# Altium schematic symbol library jlcpcb_2025_04_inductors_extended_0603.schlib: 1269 symbols (part 6 of 7) (continued)
## SDCL1608CR22JTDF
designator L?  Inductance: 220nH
Inductor, 220nH, ±5%, 2.4Ω, 200mA, SMD 0603; Manufacturer: Sunlord; Manufacturer Part Number: SDCL1608CR22JTDF; Self-Resonant Frequency: 50MHz; Q Factor: 8@50MHz; Package Size: 0603; JLCPCB Basic Part: No; JLCPCB Part Number: C22476; Supplier 1: LCSC; Category: Inductors; Supplier Part Number 1: C22476; Tolerance: ±5%; Rated Current: 200mA; DC Resistance: 2.4Ω; RoHS: Yes; ComponentLink1Description: Datasheet; ComponentLink1URL: https://wmsc.lcsc.com/wmsc/upload/file/pdf/v2/lcsc/2310301641_Sunlord-SDCL1608CR22JTDF_C22476.pdf; ComponentLink2Description: JLCPCB Part URL; ComponentLink2URL: https://jlcpcb.com/partdetail/C22476; ComponentLink3Description: LCSC Part URL; ComponentLink3URL: https://lcsc.com/product-detail/Inductors-SMD_Sunlord-Sunlord-SDCL1608CR22JTDF_C22476.html
footprint IND-0603 (0603 (1608M) Inductor)
pins: 1, 2

## SDCL1608CR27JTDF
designator L?  Inductance: 270nH
Inductor, 270nH, ±5%, 2.6Ω, 150mA, SMD 0603; Manufacturer: Sunlord; Manufacturer Part Number: SDCL1608CR27JTDF; Self-Resonant Frequency: 50MHz; Q Factor: 8@50MHz; Package Size: 0603; JLCPCB Basic Part: No; JLCPCB Part Number: C51060; Supplier 1: LCSC; Category: Inductors; Supplier Part Number 1: C51060; Tolerance: ±5%; Rated Current: 150mA; DC Resistance: 2.6Ω; RoHS: Yes; ComponentLink1Description: Datasheet; ComponentLink1URL: https://wmsc.lcsc.com/wmsc/upload/file/pdf/v2/lcsc/2310301641_Sunlord-SDCL1608CR27JTDF_C51060.pdf; ComponentLink2Description: JLCPCB Part URL; ComponentLink2URL: https://jlcpcb.com/partdetail/C51060; ComponentLink3Description: LCSC Part URL; ComponentLink3URL: https://lcsc.com/product-detail/Inductors-SMD_Sunlord-Sunlord-SDCL1608CR27JTDF_C51060.html
footprint IND-0603 (0603 (1608M) Inductor)
pins: 1, 2

## SDCL1608CR33JTDF
designator L?  Inductance: 330nH
Inductor, 330nH, ±5%, 2.8Ω, 150mA, SMD 0603; Manufacturer: Sunlord; Manufacturer Part Number: SDCL1608CR33JTDF; Self-Resonant Frequency: 50MHz; Q Factor: 8@50MHz; Package Size: 0603; JLCPCB Basic Part: No; JLCPCB Part Number: C46859; Supplier 1: LCSC; Category: Inductors; Supplier Part Number 1: C46859; Tolerance: ±5%; Rated Current: 150mA; DC Resistance: 2.8Ω; RoHS: Yes; ComponentLink1Description: Datasheet; ComponentLink1URL: https://wmsc.lcsc.com/wmsc/upload/file/pdf/v2/lcsc/2310301641_Sunlord-SDCL1608CR33JTDF_C46859.pdf; ComponentLink2Description: JLCPCB Part URL; ComponentLink2URL: https://jlcpcb.com/partdetail/C46859; ComponentLink3Description: LCSC Part URL; ComponentLink3URL: https://lcsc.com/product-detail/Inductors-SMD_Sunlord-Sunlord-SDCL1608CR33JTDF_C46859.html
footprint IND-0603 (0603 (1608M) Inductor)
pins: 1, 2

## SDCL1608CR39JTDF
designator L?  Inductance: 390nH
Inductor, 390nH, ±5%, 3.2Ω, 150mA, SMD 0603; Manufacturer: Sunlord; Manufacturer Part Number: SDCL1608CR39JTDF; Self-Resonant Frequency: 50MHz; Q Factor: 8@50MHz; Package Size: 0603; JLCPCB Basic Part: No; JLCPCB Part Number: C15565; Supplier 1: LCSC; Category: Inductors; Supplier Part Number 1: C15565; Tolerance: ±5%; Rated Current: 150mA; DC Resistance: 3.2Ω; RoHS: Yes; ComponentLink1Description: Datasheet; ComponentLink1URL: https://wmsc.lcsc.com/wmsc/upload/file/pdf/v2/lcsc/2310301641_Sunlord-SDCL1608CR39JTDF_C15565.pdf; ComponentLink2Description: JLCPCB Part URL; ComponentLink2URL: https://jlcpcb.com/partdetail/C15565; ComponentLink3Description: LCSC Part URL; ComponentLink3URL: https://lcsc.com/product-detail/Inductors-SMD_Sunlord-Sunlord-SDCL1608CR39JTDF_C15565.html
footprint IND-0603 (0603 (1608M) Inductor)
pins: 1, 2

## SDCL1608CR47JTDF
designator L?  Inductance: 470nH
Inductor, 470nH, ±5%, 3.6Ω, 150mA, SMD 0603; Manufacturer: Sunlord; Manufacturer Part Number: SDCL1608CR47JTDF; Self-Resonant Frequency: 50MHz; Q Factor: 8@50MHz; Package Size: 0603; JLCPCB Basic Part: No; JLCPCB Part Number: C21307; Supplier 1: LCSC; Category: Inductors; Supplier Part Number 1: C21307; Tolerance: ±5%; Rated Current: 150mA; DC Resistance: 3.6Ω; RoHS: Yes; ComponentLink1Description: Datasheet; ComponentLink1URL: https://wmsc.lcsc.com/wmsc/upload/file/pdf/v2/lcsc/2310301641_Sunlord-SDCL1608CR47JTDF_C21307.pdf; ComponentLink2Description: JLCPCB Part URL; ComponentLink2URL: https://jlcpcb.com/partdetail/C21307; ComponentLink3Description: LCSC Part URL; ComponentLink3URL: https://lcsc.com/product-detail/Inductors-SMD_Sunlord-Sunlord-SDCL1608CR47JTDF_C21307.html
footprint IND-0603 (0603 (1608M) Inductor)
pins: 1, 2

## SDCL1608CR56JTDF
designator L?  Inductance: 560nH
Inductor, 560nH, ±5%, 4Ω, 100mA, SMD 0603; Manufacturer: Sunlord; Manufacturer Part Number: SDCL1608CR56JTDF; Self-Resonant Frequency: 50MHz; Q Factor: 8@50MHz; Package Size: 0603; JLCPCB Basic Part: No; JLCPCB Part Number: C83787; Supplier 1: LCSC; Category: Inductors; Supplier Part Number 1: C83787; Tolerance: ±5%; Rated Current: 100mA; DC Resistance: 4Ω; RoHS: Yes; ComponentLink1Description: Datasheet; ComponentLink1URL: https://wmsc.lcsc.com/wmsc/upload/file/pdf/v2/lcsc/2310301641_Sunlord-SDCL1608CR56JTDF_C83787.pdf; ComponentLink2Description: JLCPCB Part URL; ComponentLink2URL: https://jlcpcb.com/partdetail/C83787; ComponentLink3Description: LCSC Part URL; ComponentLink3URL: https://lcsc.com/product-detail/Inductors-SMD_Sunlord-Sunlord-SDCL1608CR56JTDF_C83787.html
footprint IND-0603 (0603 (1608M) Inductor)
pins: 1, 2

## SDCL1608CR68JTDF
designator L?  Inductance: 680nH
Inductor, 680nH, ±5%, 4.5Ω, 100mA, SMD 0603; Manufacturer: Sunlord; Manufacturer Part Number: SDCL1608CR68JTDF; Self-Resonant Frequency: 50MHz; Q Factor: 8@50MHz; Package Size: 0603; JLCPCB Basic Part: No; JLCPCB Part Number: C55546; Supplier 1: LCSC; Category: Inductors; Supplier Part Number 1: C55546; Tolerance: ±5%; Rated Current: 100mA; DC Resistance: 4.5Ω; RoHS: Yes; ComponentLink1Description: Datasheet; ComponentLink1URL: https://wmsc.lcsc.com/wmsc/upload/file/pdf/v2/lcsc/2310301641_Sunlord-SDCL1608CR68JTDF_C55546.pdf; ComponentLink2Description: JLCPCB Part URL; ComponentLink2URL: https://jlcpcb.com/partdetail/C55546; ComponentLink3Description: LCSC Part URL; ComponentLink3URL: https://lcsc.com/product-detail/Inductors-SMD_Sunlord-Sunlord-SDCL1608CR68JTDF_C55546.html
footprint IND-0603 (0603 (1608M) Inductor)
pins: 1, 2

## SDFL1608L47NKTF
designator L?  Inductance: 47nH
Inductor, 47nH, ±10%, 300mΩ, 50mA, SMD 0603; Manufacturer: Sunlord; Manufacturer Part Number: SDFL1608L47NKTF; Self-Resonant Frequency: 50MHz; Q Factor: 10@50MHz; Package Size: 0603; JLCPCB Basic Part: No; JLCPCB Part Number: C370262; Supplier 1: LCSC; Category: Inductors; Supplier Part Number 1: C370262; Tolerance: ±10%; Rated Current: 50mA; DC Resistance: 300mΩ; RoHS: Yes; ComponentLink1Description: Datasheet; ComponentLink1URL: https://wmsc.lcsc.com/wmsc/upload/file/pdf/v2/lcsc/2310301641_Sunlord-SDFL1608L47NKTF_C370262.pdf; ComponentLink2Description: JLCPCB Part URL; ComponentLink2URL: https://jlcpcb.com/partdetail/C370262; ComponentLink3Description: LCSC Part URL; ComponentLink3URL: https://lcsc.com/product-detail/Inductors-SMD_Sunlord-Sunlord-SDFL1608L47NKTF_C370262.html
footprint IND-0603 (0603 (1608M) Inductor)
pins: 1, 2

## SDFL1608L82NKTF
designator L?  Inductance: 82nH
Inductor, 82nH, ±10%, 300mΩ, 50mA, SMD 0603; Manufacturer: Sunlord; Manufacturer Part Number: SDFL1608L82NKTF; Self-Resonant Frequency: 50MHz; Q Factor: 10@50MHz; Package Size: 0603; JLCPCB Basic Part: No; JLCPCB Part Number: C370263; Supplier 1: LCSC; Category: Inductors; Supplier Part Number 1: C370263; Tolerance: ±10%; Rated Current: 50mA; DC Resistance: 300mΩ; RoHS: Yes; ComponentLink1Description: Datasheet; ComponentLink1URL: https://wmsc.lcsc.com/wmsc/upload/file/pdf/v2/lcsc/2310301641_Sunlord-SDFL1608L82NKTF_C370263.pdf; ComponentLink2Description: JLCPCB Part URL; ComponentLink2URL: https://jlcpcb.com/partdetail/C370263; ComponentLink3Description: LCSC Part URL; ComponentLink3URL: https://lcsc.com/product-detail/Inductors-SMD_Sunlord-Sunlord-SDFL1608L82NKTF_C370263.html
footprint IND-0603 (0603 (1608M) Inductor)
pins: 1, 2

## SDFL1608LR10KTF
designator L?  Inductance: 100nH
Inductor, 100nH, ±10%, 500mΩ, 50mA, SMD 0603; Manufacturer: Sunlord; Manufacturer Part Number: SDFL1608LR10KTF; Q Factor: 15@25MHz; Package Size: 0603; JLCPCB Basic Part: No; JLCPCB Part Number: C279840; Supplier 1: LCSC; Category: Inductors; Supplier Part Number 1: C279840; Tolerance: ±10%; Rated Current: 50mA; DC Resistance: 500mΩ; RoHS: Yes; ComponentLink1Description: Datasheet; ComponentLink1URL: https://wmsc.lcsc.com/wmsc/upload/file/pdf/v2/lcsc/2310301641_Sunlord-SDFL1608LR10KTF_C279840.pdf; ComponentLink2Description: JLCPCB Part URL; ComponentLink2URL: https://jlcpcb.com/partdetail/C279840; ComponentLink3Description: LCSC Part URL; ComponentLink3URL: https://lcsc.com/product-detail/Inductors-SMD_Sunlord-Sunlord-SDFL1608LR10KTF_C279840.html
footprint IND-0603 (0603 (1608M) Inductor)
pins: 1, 2

## SDFL1608LR12KTF
designator L?  Inductance: 120nH
Inductor, 120nH, ±10%, 500mΩ, 50mA, SMD 0603; Manufacturer: Sunlord; Manufacturer Part Number: SDFL1608LR12KTF; Self-Resonant Frequency: 25MHz; Q Factor: 15@25MHz; Package Size: 0603; JLCPCB Basic Part: No; JLCPCB Part Number: C95957; Supplier 1: LCSC; Category: Inductors; Supplier Part Number 1: C95957; Tolerance: ±10%; Rated Current: 50mA; DC Resistance: 500mΩ; RoHS: Yes; ComponentLink1Description: Datasheet; ComponentLink1URL: https://wmsc.lcsc.com/wmsc/upload/file/pdf/v2/lcsc/2310301641_Sunlord-SDFL1608LR12KTF_C95957.pdf; ComponentLink2Description: JLCPCB Part URL; ComponentLink2URL: https://jlcpcb.com/partdetail/C95957; ComponentLink3Description: LCSC Part URL; ComponentLink3URL: https://lcsc.com/product-detail/Inductors-SMD_Sunlord-Sunlord-SDFL1608LR12KTF_C95957.html
footprint IND-0603 (0603 (1608M) Inductor)
pins: 1, 2

## SDFL1608LR15KTF
designator L?  Inductance: 150nH
Inductor, 150nH, ±10%, 600mΩ, 50mA, SMD 0603; Manufacturer: Sunlord; Manufacturer Part Number: SDFL1608LR15KTF; Self-Resonant Frequency: 25MHz; Q Factor: 15@25MHz; Package Size: 0603; JLCPCB Basic Part: No; JLCPCB Part Number: C279935; Supplier 1: LCSC; Category: Inductors; Supplier Part Number 1: C279935; Tolerance: ±10%; Rated Current: 50mA; DC Resistance: 600mΩ; RoHS: Yes; ComponentLink1Description: Datasheet; ComponentLink1URL: https://wmsc.lcsc.com/wmsc/upload/file/pdf/v2/lcsc/2310301641_Sunlord-SDFL1608LR15KTF_C279935.pdf; ComponentLink2Description: JLCPCB Part URL; ComponentLink2URL: https://jlcpcb.com/partdetail/C279935; ComponentLink3Description: LCSC Part URL; ComponentLink3URL: https://lcsc.com/product-detail/Inductors-SMD_Sunlord-Sunlord-SDFL1608LR15KTF_C279935.html
footprint IND-0603 (0603 (1608M) Inductor)
pins: 1, 2

## SDFL1608LR27KTF
designator L?  Inductance: 270nH
Inductor, 270nH, ±10%, 800mΩ, 50mA, SMD 0603; Manufacturer: Sunlord; Manufacturer Part Number: SDFL1608LR27KTF; Self-Resonant Frequency: 25MHz; Q Factor: 15@25MHz; Package Size: 0603; JLCPCB Basic Part: No; JLCPCB Part Number: C95959; Supplier 1: LCSC; Category: Inductors; Supplier Part Number 1: C95959; Tolerance: ±10%; Rated Current: 50mA; DC Resistance: 800mΩ; RoHS: Yes; ComponentLink1Description: Datasheet; ComponentLink1URL: https://wmsc.lcsc.com/wmsc/upload/file/pdf/v2/lcsc/2310301641_Sunlord-SDFL1608LR27KTF_C95959.pdf; ComponentLink2Description: JLCPCB Part URL; ComponentLink2URL: https://jlcpcb.com/partdetail/C95959; ComponentLink3Description: LCSC Part URL; ComponentLink3URL: https://lcsc.com/product-detail/Inductors-SMD_Sunlord-Sunlord-SDFL1608LR27KTF_C95959.html
footprint IND-0603 (0603 (1608M) Inductor)
pins: 1, 2

## SDFL1608LR33KTF
designator L?  Inductance: 330nH
Inductor, 330nH, ±10%, 850mΩ, 35mA, SMD 0603; Manufacturer: Sunlord; Manufacturer Part Number: SDFL1608LR33KTF; Self-Resonant Frequency: 25MHz; Q Factor: 15@25MHz; Package Size: 0603; JLCPCB Basic Part: No; JLCPCB Part Number: C95960; Supplier 1: LCSC; Category: Inductors; Supplier Part Number 1: C95960; Tolerance: ±10%; Rated Current: 35mA; DC Resistance: 850mΩ; RoHS: Yes; ComponentLink1Description: Datasheet; ComponentLink1URL: https://wmsc.lcsc.com/wmsc/upload/file/pdf/v2/lcsc/2310301641_Sunlord-SDFL1608LR33KTF_C95960.pdf; ComponentLink2Description: JLCPCB Part URL; ComponentLink2URL: https://jlcpcb.com/partdetail/C95960; ComponentLink3Description: LCSC Part URL; ComponentLink3URL: https://lcsc.com/product-detail/Inductors-SMD_Sunlord-Sunlord-SDFL1608LR33KTF_C95960.html
footprint IND-0603 (0603 (1608M) Inductor)
pins: 1, 2

## SDFL1608LR39KTF
designator L?  Inductance: 390nH
Inductor, 390nH, ±10%, 1Ω, 35mA, SMD 0603; Manufacturer: Sunlord; Manufacturer Part Number: SDFL1608LR39KTF; Q Factor: 15@25MHz; Package Size: 0603; JLCPCB Basic Part: No; JLCPCB Part Number: C95961; Supplier 1: LCSC; Category: Inductors; Supplier Part Number 1: C95961; Tolerance: ±10%; Rated Current: 35mA; DC Resistance: 1Ω; RoHS: Yes; ComponentLink1Description: Datasheet; ComponentLink1URL: https://wmsc.lcsc.com/wmsc/upload/file/pdf/v2/lcsc/2310301641_Sunlord-SDFL1608LR39KTF_C95961.pdf; ComponentLink2Description: JLCPCB Part URL; ComponentLink2URL: https://jlcpcb.com/partdetail/C95961; ComponentLink3Description: LCSC Part URL; ComponentLink3URL: https://lcsc.com/product-detail/Inductors-SMD_Sunlord-Sunlord-SDFL1608LR39KTF_C95961.html
footprint IND-0603 (0603 (1608M) Inductor)
pins: 1, 2

## SDFL1608LR47KTF
designator L?  Inductance: 470nH
Inductor, 470nH, ±10%, 1.35Ω, 35mA, SMD 0603; Manufacturer: Sunlord; Manufacturer Part Number: SDFL1608LR47KTF; Self-Resonant Frequency: 25MHz; Q Factor: 15@25MHz; Package Size: 0603; JLCPCB Basic Part: No; JLCPCB Part Number: C95962; Supplier 1: LCSC; Category: Inductors; Supplier Part Number 1: C95962; Tolerance: ±10%; Rated Current: 35mA; DC Resistance: 1.35Ω; RoHS: Yes; ComponentLink1Description: Datasheet; ComponentLink1URL: https://wmsc.lcsc.com/wmsc/upload/file/pdf/v2/lcsc/2310301641_Sunlord-SDFL1608LR47KTF_C95962.pdf; ComponentLink2Description: JLCPCB Part URL; ComponentLink2URL: https://jlcpcb.com/partdetail/C95962; ComponentLink3Description: LCSC Part URL; ComponentLink3URL: https://lcsc.com/product-detail/Inductors-SMD_Sunlord-Sunlord-SDFL1608LR47KTF_C95962.html
footprint IND-0603 (0603 (1608M) Inductor)
pins: 1, 2

## SDFL1608LR47KTFB01
designator L?  Inductance: 470nH
Inductor, 470nH, SMD 0603; Manufacturer: Sunlord; Manufacturer Part Number: SDFL1608LR47KTFB01; Package Size: 0603; JLCPCB Basic Part: No; JLCPCB Part Number: C882646; Supplier 1: LCSC; Category: Inductors; Supplier Part Number 1: C882646; RoHS: Yes; ComponentLink1Description: Datasheet; ComponentLink1URL: https://wmsc.lcsc.com/wmsc/upload/file/pdf/v2/lcsc/2110081730_Sunlord-SDFL1608LR47KTFB01_C882646.pdf; ComponentLink2Description: JLCPCB Part URL; ComponentLink2URL: https://jlcpcb.com/partdetail/C882646; ComponentLink3Description: LCSC Part URL; ComponentLink3URL: https://lcsc.com/product-detail/Inductors-SMD_Sunlord-Sunlord-SDFL1608LR47KTFB01_C882646.html
footprint IND-0603 (0603 (1608M) Inductor)
pins: 1, 2

## SDFL1608LR56KTF
designator L?  Inductance: 560nH
Inductor, 560nH, ±10%, 1.55Ω, 35mA, SMD 0603; Manufacturer: Sunlord; Manufacturer Part Number: SDFL1608LR56KTF; Self-Resonant Frequency: 25MHz; Q Factor: 15@25MHz; Package Size: 0603; JLCPCB Basic Part: No; JLCPCB Part Number: C95963; Supplier 1: LCSC; Category: Inductors; Supplier Part Number 1: C95963; Tolerance: ±10%; Rated Current: 35mA; DC Resistance: 1.55Ω; RoHS: Yes; ComponentLink1Description: Datasheet; ComponentLink1URL: https://wmsc.lcsc.com/wmsc/upload/file/pdf/v2/lcsc/2310301641_Sunlord-SDFL1608LR56KTF_C95963.pdf; ComponentLink2Description: JLCPCB Part URL; ComponentLink2URL: https://jlcpcb.com/partdetail/C95963; ComponentLink3Description: LCSC Part URL; ComponentLink3URL: https://lcsc.com/product-detail/Inductors-SMD_Sunlord-Sunlord-SDFL1608LR56KTF_C95963.html
footprint IND-0603 (0603 (1608M) Inductor)
pins: 1, 2

## SDFL1608LR68KTF
designator L?  Inductance: 680nH
Inductor, 680nH, ±10%, 1.7Ω, 35mA, SMD 0603; Manufacturer: Sunlord; Manufacturer Part Number: SDFL1608LR68KTF; Self-Resonant Frequency: 25MHz; Q Factor: 15@25MHz; Package Size: 0603; JLCPCB Basic Part: No; JLCPCB Part Number: C370264; Supplier 1: LCSC; Category: Inductors; Supplier Part Number 1: C370264; Tolerance: ±10%; Rated Current: 35mA; DC Resistance: 1.7Ω; RoHS: Yes; ComponentLink1Description: Datasheet; ComponentLink1URL: https://wmsc.lcsc.com/wmsc/upload/file/pdf/v2/lcsc/2310301641_Sunlord-SDFL1608LR68KTF_C370264.pdf; ComponentLink2Description: JLCPCB Part URL; ComponentLink2URL: https://jlcpcb.com/partdetail/C370264; ComponentLink3Description: LCSC Part URL; ComponentLink3URL: https://lcsc.com/product-detail/Inductors-SMD_Sunlord-Sunlord-SDFL1608LR68KTF_C370264.html
footprint IND-0603 (0603 (1608M) Inductor)
pins: 1, 2

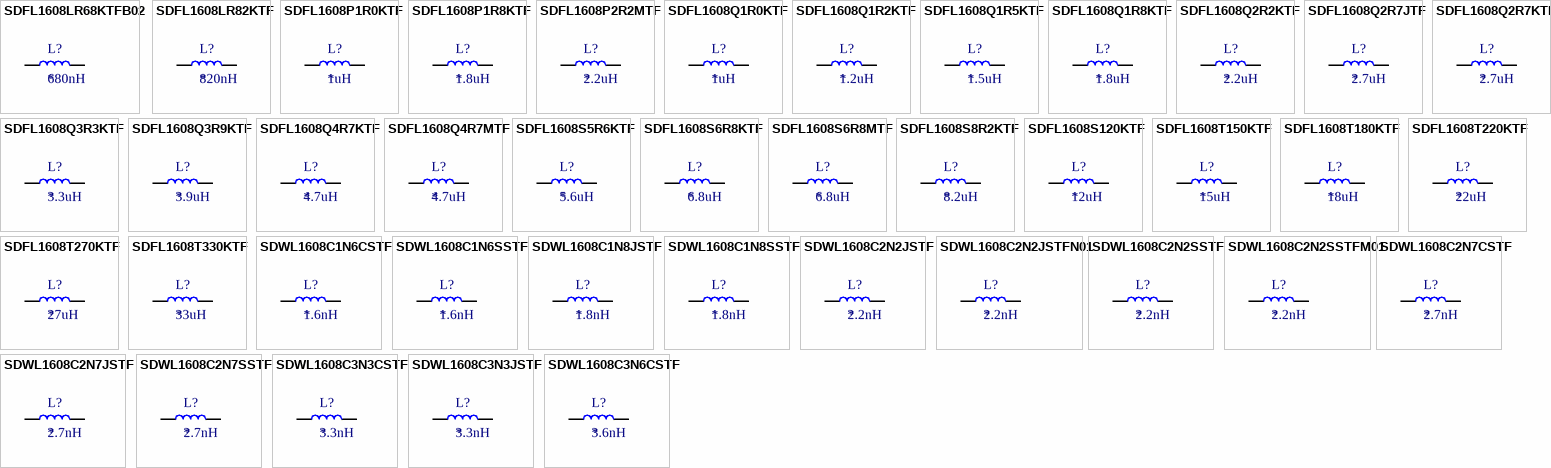
[diagram p26: symbols SDFL1608LR68KTFB02 to SDWL1608C3N6CSTF]

## SDFL1608LR68KTFB02
designator L?  Inductance: 680nH
Inductor, 680nH, ±10%, SMD 0603; Manufacturer: Sunlord; Manufacturer Part Number: SDFL1608LR68KTFB02; Package Size: 0603; JLCPCB Basic Part: No; JLCPCB Part Number: C389731; Supplier 1: LCSC; Category: Inductors; Supplier Part Number 1: C389731; Tolerance: ±10%; RoHS: Yes; ComponentLink1Description: Datasheet; ComponentLink1URL: https://wmsc.lcsc.com/wmsc/upload/file/pdf/v2/lcsc/2110081530_Sunlord-SDFL1608LR68KTFB02_C389731.pdf; ComponentLink2Description: JLCPCB Part URL; ComponentLink2URL: https://jlcpcb.com/partdetail/C389731; ComponentLink3Description: LCSC Part URL; ComponentLink3URL: https://lcsc.com/product-detail/Inductors-SMD_Sunlord-Sunlord-SDFL1608LR68KTFB02_C389731.html
footprint IND-0603 (0603 (1608M) Inductor)
pins: 1, 2

## SDFL1608LR82KTF
designator L?  Inductance: 820nH
Inductor, 820nH, ±10%, 2.1Ω, 35mA, SMD 0603; Manufacturer: Sunlord; Manufacturer Part Number: SDFL1608LR82KTF; Self-Resonant Frequency: 25MHz; Q Factor: 15@25MHz; Package Size: 0603; JLCPCB Basic Part: No; JLCPCB Part Number: C74313; Supplier 1: LCSC; Category: Inductors; Supplier Part Number 1: C74313; Tolerance: ±10%; Rated Current: 35mA; DC Resistance: 2.1Ω; RoHS: Yes; ComponentLink1Description: Datasheet; ComponentLink1URL: https://wmsc.lcsc.com/wmsc/upload/file/pdf/v2/lcsc/2310301641_Sunlord-SDFL1608LR82KTF_C74313.pdf; ComponentLink2Description: JLCPCB Part URL; ComponentLink2URL: https://jlcpcb.com/partdetail/C74313; ComponentLink3Description: LCSC Part URL; ComponentLink3URL: https://lcsc.com/product-detail/Inductors-SMD_Sunlord-Sunlord-SDFL1608LR82KTF_C74313.html
footprint IND-0603 (0603 (1608M) Inductor)
pins: 1, 2

## SDFL1608P1R0KTF
designator L?  Inductance: 1uH
Inductor, 1uH, ±10%, 600mΩ, 25mA, SMD 0603; Manufacturer: Sunlord; Manufacturer Part Number: SDFL1608P1R0KTF; Self-Resonant Frequency: 10MHz; Q Factor: 35@10MHz; Package Size: 0603; JLCPCB Basic Part: No; JLCPCB Part Number: C370265; Supplier 1: LCSC; Category: Inductors; Supplier Part Number 1: C370265; Tolerance: ±10%; Rated Current: 25mA; DC Resistance: 600mΩ; RoHS: Yes; ComponentLink1Description: Datasheet; ComponentLink1URL: https://wmsc.lcsc.com/wmsc/upload/file/pdf/v2/lcsc/2310301641_Sunlord-SDFL1608P1R0KTF_C370265.pdf; ComponentLink2Description: JLCPCB Part URL; ComponentLink2URL: https://jlcpcb.com/partdetail/C370265; ComponentLink3Description: LCSC Part URL; ComponentLink3URL: https://lcsc.com/product-detail/Inductors-SMD_Sunlord-Sunlord-SDFL1608P1R0KTF_C370265.html
footprint IND-0603 (0603 (1608M) Inductor)
pins: 1, 2

## SDFL1608P1R8KTF
designator L?  Inductance: 1.8uH
Inductor, 1.8uH, ±10%, 950mΩ, 25mA, SMD 0603; Manufacturer: Sunlord; Manufacturer Part Number: SDFL1608P1R8KTF; Self-Resonant Frequency: 10MHz; Q Factor: 35@10MHz; Package Size: 0603; JLCPCB Basic Part: No; JLCPCB Part Number: C279914; Supplier 1: LCSC; Category: Inductors; Supplier Part Number 1: C279914; Tolerance: ±10%; Rated Current: 25mA; DC Resistance: 950mΩ; RoHS: Yes; ComponentLink1Description: Datasheet; ComponentLink1URL: https://wmsc.lcsc.com/wmsc/upload/file/pdf/v2/lcsc/2310301641_Sunlord-SDFL1608P1R8KTF_C279914.pdf; ComponentLink2Description: JLCPCB Part URL; ComponentLink2URL: https://jlcpcb.com/partdetail/C279914; ComponentLink3Description: LCSC Part URL; ComponentLink3URL: https://lcsc.com/product-detail/Inductors-SMD_Sunlord-Sunlord-SDFL1608P1R8KTF_C279914.html
footprint IND-0603 (0603 (1608M) Inductor)
pins: 1, 2

## SDFL1608P2R2MTF
designator L?  Inductance: 2.2uH
Inductor, 2.2uH, ±20%, 1.15Ω, 15mA, SMD 0603; Manufacturer: Sunlord; Manufacturer Part Number: SDFL1608P2R2MTF; Self-Resonant Frequency: 10MHz; Q Factor: 35@10MHz; Package Size: 0603; JLCPCB Basic Part: No; JLCPCB Part Number: C316407; Supplier 1: LCSC; Category: Inductors; Supplier Part Number 1: C316407; Tolerance: ±20%; Rated Current: 15mA; DC Resistance: 1.15Ω; RoHS: Yes; ComponentLink1Description: Datasheet; ComponentLink1URL: https://wmsc.lcsc.com/wmsc/upload/file/pdf/v2/lcsc/2310301641_Sunlord-SDFL1608P2R2MTF_C316407.pdf; ComponentLink2Description: JLCPCB Part URL; ComponentLink2URL: https://jlcpcb.com/partdetail/C316407; ComponentLink3Description: LCSC Part URL; ComponentLink3URL: https://lcsc.com/product-detail/Inductors-SMD_Sunlord-Sunlord-SDFL1608P2R2MTF_C316407.html
footprint IND-0603 (0603 (1608M) Inductor)
pins: 1, 2

## SDFL1608Q1R0KTF
designator L?  Inductance: 1uH
Inductor, 1uH, ±10%, 600mΩ, 25mA, SMD 0603; Manufacturer: Sunlord; Manufacturer Part Number: SDFL1608Q1R0KTF; Self-Resonant Frequency: 10MHz; Q Factor: 35@10MHz; Package Size: 0603; JLCPCB Basic Part: No; JLCPCB Part Number: C22037; Supplier 1: LCSC; Category: Inductors; Supplier Part Number 1: C22037; Tolerance: ±10%; Rated Current: 25mA; DC Resistance: 600mΩ; RoHS: Yes; ComponentLink1Description: Datasheet; ComponentLink1URL: https://wmsc.lcsc.com/wmsc/upload/file/pdf/v2/lcsc/2310301641_Sunlord-SDFL1608Q1R0KTF_C22037.pdf; ComponentLink2Description: JLCPCB Part URL; ComponentLink2URL: https://jlcpcb.com/partdetail/C22037; ComponentLink3Description: LCSC Part URL; ComponentLink3URL: https://lcsc.com/product-detail/Inductors-SMD_Sunlord-Sunlord-SDFL1608Q1R0KTF_C22037.html
footprint IND-0603 (0603 (1608M) Inductor)
pins: 1, 2

## SDFL1608Q1R2KTF
designator L?  Inductance: 1.2uH
Inductor, 1.2uH, ±10%, 800mΩ, 25mA, SMD 0603; Manufacturer: Sunlord; Manufacturer Part Number: SDFL1608Q1R2KTF; Self-Resonant Frequency: 10MHz; Q Factor: 35@10MHz; Package Size: 0603; JLCPCB Basic Part: No; JLCPCB Part Number: C78176; Supplier 1: LCSC; Category: Inductors; Supplier Part Number 1: C78176; Tolerance: ±10%; Rated Current: 25mA; DC Resistance: 800mΩ; RoHS: Yes; ComponentLink1Description: Datasheet; ComponentLink1URL: https://wmsc.lcsc.com/wmsc/upload/file/pdf/v2/lcsc/2310301641_Sunlord-SDFL1608Q1R2KTF_C78176.pdf; ComponentLink2Description: JLCPCB Part URL; ComponentLink2URL: https://jlcpcb.com/partdetail/C78176; ComponentLink3Description: LCSC Part URL; ComponentLink3URL: https://lcsc.com/product-detail/Inductors-SMD_Sunlord-Sunlord-SDFL1608Q1R2KTF_C78176.html
footprint IND-0603 (0603 (1608M) Inductor)
pins: 1, 2

## SDFL1608Q1R5KTF
designator L?  Inductance: 1.5uH
Inductor, 1.5uH, ±10%, 800mΩ, 25mA, SMD 0603; Manufacturer: Sunlord; Manufacturer Part Number: SDFL1608Q1R5KTF; Self-Resonant Frequency: 10MHz; Q Factor: 35@10MHz; Package Size: 0603; JLCPCB Basic Part: No; JLCPCB Part Number: C73201; Supplier 1: LCSC; Category: Inductors; Supplier Part Number 1: C73201; Tolerance: ±10%; Rated Current: 25mA; DC Resistance: 800mΩ; RoHS: Yes; ComponentLink1Description: Datasheet; ComponentLink1URL: https://wmsc.lcsc.com/wmsc/upload/file/pdf/v2/lcsc/2310301641_Sunlord-SDFL1608Q1R5KTF_C73201.pdf; ComponentLink2Description: JLCPCB Part URL; ComponentLink2URL: https://jlcpcb.com/partdetail/C73201; ComponentLink3Description: LCSC Part URL; ComponentLink3URL: https://lcsc.com/product-detail/Inductors-SMD_Sunlord-Sunlord-SDFL1608Q1R5KTF_C73201.html
footprint IND-0603 (0603 (1608M) Inductor)
pins: 1, 2

## SDFL1608Q1R8KTF
designator L?  Inductance: 1.8uH
Inductor, 1.8uH, ±10%, 950mΩ, 25mA, SMD 0603; Manufacturer: Sunlord; Manufacturer Part Number: SDFL1608Q1R8KTF; Self-Resonant Frequency: 10MHz; Q Factor: 35@10MHz; Package Size: 0603; JLCPCB Basic Part: No; JLCPCB Part Number: C78153; Supplier 1: LCSC; Category: Inductors; Supplier Part Number 1: C78153; Tolerance: ±10%; Rated Current: 25mA; DC Resistance: 950mΩ; RoHS: Yes; ComponentLink1Description: Datasheet; ComponentLink1URL: https://wmsc.lcsc.com/wmsc/upload/file/pdf/v2/lcsc/2310301641_Sunlord-SDFL1608Q1R8KTF_C78153.pdf; ComponentLink2Description: JLCPCB Part URL; ComponentLink2URL: https://jlcpcb.com/partdetail/C78153; ComponentLink3Description: LCSC Part URL; ComponentLink3URL: https://lcsc.com/product-detail/Inductors-SMD_Sunlord-Sunlord-SDFL1608Q1R8KTF_C78153.html
footprint IND-0603 (0603 (1608M) Inductor)
pins: 1, 2

## SDFL1608Q2R2KTF
designator L?  Inductance: 2.2uH
Inductor, 2.2uH, ±10%, 1.15Ω, 15mA, SMD 0603; Manufacturer: Sunlord; Manufacturer Part Number: SDFL1608Q2R2KTF; Self-Resonant Frequency: 10MHz; Q Factor: 35@10MHz; Package Size: 0603; JLCPCB Basic Part: No; JLCPCB Part Number: C1033; Supplier 1: LCSC; Category: Inductors; Supplier Part Number 1: C1033; Tolerance: ±10%; Rated Current: 15mA; DC Resistance: 1.15Ω; RoHS: Yes; ComponentLink1Description: Datasheet; ComponentLink1URL: https://wmsc.lcsc.com/wmsc/upload/file/pdf/v2/lcsc/2310301641_Sunlord-SDFL1608Q2R2KTF_C1033.pdf; ComponentLink2Description: JLCPCB Part URL; ComponentLink2URL: https://jlcpcb.com/partdetail/C1033; ComponentLink3Description: LCSC Part URL; ComponentLink3URL: https://lcsc.com/product-detail/Inductors-SMD_Sunlord-Sunlord-SDFL1608Q2R2KTF_C1033.html
footprint IND-0603 (0603 (1608M) Inductor)
pins: 1, 2

## SDFL1608Q2R7JTF
designator L?  Inductance: 2.7uH
Inductor, 2.7uH, ±5%, 1.35Ω, 15mA, SMD 0603; Manufacturer: Sunlord; Manufacturer Part Number: SDFL1608Q2R7JTF; Package Size: 0603; JLCPCB Basic Part: No; JLCPCB Part Number: C279824; Supplier 1: LCSC; Category: Inductors; Supplier Part Number 1: C279824; Tolerance: ±5%; Rated Current: 15mA; DC Resistance: 1.35Ω; RoHS: Yes; ComponentLink1Description: Datasheet; ComponentLink1URL: https://wmsc.lcsc.com/wmsc/upload/file/pdf/v2/lcsc/2310301641_Sunlord-SDFL1608Q2R7JTF_C279824.pdf; ComponentLink2Description: JLCPCB Part URL; ComponentLink2URL: https://jlcpcb.com/partdetail/C279824; ComponentLink3Description: LCSC Part URL; ComponentLink3URL: https://lcsc.com/product-detail/Inductors-SMD_Sunlord-Sunlord-SDFL1608Q2R7JTF_C279824.html
footprint IND-0603 (0603 (1608M) Inductor)
pins: 1, 2

## SDFL1608Q2R7KTF
designator L?  Inductance: 2.7uH
Inductor, 2.7uH, ±10%, 1.35Ω, 15mA, SMD 0603; Manufacturer: Sunlord; Manufacturer Part Number: SDFL1608Q2R7KTF; Self-Resonant Frequency: 10MHz; Q Factor: 35@10MHz; Package Size: 0603; JLCPCB Basic Part: No; JLCPCB Part Number: C29946; Supplier 1: LCSC; Category: Inductors; Supplier Part Number 1: C29946; Tolerance: ±10%; Rated Current: 15mA; DC Resistance: 1.35Ω; RoHS: Yes; ComponentLink1Description: Datasheet; ComponentLink1URL: https://wmsc.lcsc.com/wmsc/upload/file/pdf/v2/lcsc/2310301641_Sunlord-SDFL1608Q2R7KTF_C29946.pdf; ComponentLink2Description: JLCPCB Part URL; ComponentLink2URL: https://jlcpcb.com/partdetail/C29946; ComponentLink3Description: LCSC Part URL; ComponentLink3URL: https://lcsc.com/product-detail/Inductors-SMD_Sunlord-Sunlord-SDFL1608Q2R7KTF_C29946.html
footprint IND-0603 (0603 (1608M) Inductor)
pins: 1, 2

## SDFL1608Q3R3KTF
designator L?  Inductance: 3.3uH
Inductor, 3.3uH, ±10%, 1.55Ω, 15mA, SMD 0603; Manufacturer: Sunlord; Manufacturer Part Number: SDFL1608Q3R3KTF; Self-Resonant Frequency: 10MHz; Q Factor: 35@10MHz; Package Size: 0603; JLCPCB Basic Part: No; JLCPCB Part Number: C12589; Supplier 1: LCSC; Category: Inductors; Supplier Part Number 1: C12589; Tolerance: ±10%; Rated Current: 15mA; DC Resistance: 1.55Ω; RoHS: Yes; ComponentLink1Description: Datasheet; ComponentLink1URL: https://wmsc.lcsc.com/wmsc/upload/file/pdf/v2/lcsc/2310301641_Sunlord-SDFL1608Q3R3KTF_C12589.pdf; ComponentLink2Description: JLCPCB Part URL; ComponentLink2URL: https://jlcpcb.com/partdetail/C12589; ComponentLink3Description: LCSC Part URL; ComponentLink3URL: https://lcsc.com/product-detail/Inductors-SMD_Sunlord-Sunlord-SDFL1608Q3R3KTF_C12589.html
footprint IND-0603 (0603 (1608M) Inductor)
pins: 1, 2

## SDFL1608Q3R9KTF
designator L?  Inductance: 3.9uH
Inductor, 3.9uH, ±10%, 1.7Ω, 15mA, SMD 0603; Manufacturer: Sunlord; Manufacturer Part Number: SDFL1608Q3R9KTF; Self-Resonant Frequency: 10MHz; Q Factor: 35@10MHz; Package Size: 0603; JLCPCB Basic Part: No; JLCPCB Part Number: C57836; Supplier 1: LCSC; Category: Inductors; Supplier Part Number 1: C57836; Tolerance: ±10%; Rated Current: 15mA; DC Resistance: 1.7Ω; RoHS: Yes; ComponentLink1Description: Datasheet; ComponentLink1URL: https://wmsc.lcsc.com/wmsc/upload/file/pdf/v2/lcsc/2310301641_Sunlord-SDFL1608Q3R9KTF_C57836.pdf; ComponentLink2Description: JLCPCB Part URL; ComponentLink2URL: https://jlcpcb.com/partdetail/C57836; ComponentLink3Description: LCSC Part URL; ComponentLink3URL: https://lcsc.com/product-detail/Inductors-SMD_Sunlord-Sunlord-SDFL1608Q3R9KTF_C57836.html
footprint IND-0603 (0603 (1608M) Inductor)
pins: 1, 2

## SDFL1608Q4R7KTF
designator L?  Inductance: 4.7uH
Inductor, 4.7uH, ±10%, 2.1Ω, 15mA, SMD 0603; Manufacturer: Sunlord; Manufacturer Part Number: SDFL1608Q4R7KTF; Self-Resonant Frequency: 10MHz; Q Factor: 35@10MHz; Package Size: 0603; JLCPCB Basic Part: No; JLCPCB Part Number: C1034; Supplier 1: LCSC; Category: Inductors; Supplier Part Number 1: C1034; Tolerance: ±10%; Rated Current: 15mA; DC Resistance: 2.1Ω; RoHS: Yes; ComponentLink1Description: Datasheet; ComponentLink1URL: https://wmsc.lcsc.com/wmsc/upload/file/pdf/v2/lcsc/2310301641_Sunlord-SDFL1608Q4R7KTF_C1034.pdf; ComponentLink2Description: JLCPCB Part URL; ComponentLink2URL: https://jlcpcb.com/partdetail/C1034; ComponentLink3Description: LCSC Part URL; ComponentLink3URL: https://lcsc.com/product-detail/Inductors-SMD_Sunlord-Sunlord-SDFL1608Q4R7KTF_C1034.html
footprint IND-0603 (0603 (1608M) Inductor)
pins: 1, 2

## SDFL1608Q4R7MTF
designator L?  Inductance: 4.7uH
Inductor, 4.7uH, ±20%, 2.1Ω, 15mA, SMD 0603; Manufacturer: Sunlord; Manufacturer Part Number: SDFL1608Q4R7MTF; Self-Resonant Frequency: 10MHz; Q Factor: 35@10MHz; Package Size: 0603; JLCPCB Basic Part: No; JLCPCB Part Number: C279810; Supplier 1: LCSC; Category: Inductors; Supplier Part Number 1: C279810; Tolerance: ±20%; Rated Current: 15mA; DC Resistance: 2.1Ω; RoHS: Yes; ComponentLink1Description: Datasheet; ComponentLink1URL: https://wmsc.lcsc.com/wmsc/upload/file/pdf/v2/lcsc/2310301641_Sunlord-SDFL1608Q4R7MTF_C279810.pdf; ComponentLink2Description: JLCPCB Part URL; ComponentLink2URL: https://jlcpcb.com/partdetail/C279810; ComponentLink3Description: LCSC Part URL; ComponentLink3URL: https://lcsc.com/product-detail/Inductors-SMD_Sunlord-Sunlord-SDFL1608Q4R7MTF_C279810.html
footprint IND-0603 (0603 (1608M) Inductor)
pins: 1, 2

## SDFL1608S5R6KTF
designator L?  Inductance: 5.6uH
Inductor, 5.6uH, ±10%, 1.55Ω, 5mA, SMD 0603; Manufacturer: Sunlord; Manufacturer Part Number: SDFL1608S5R6KTF; Self-Resonant Frequency: 4MHz; Q Factor: 35@4MHz; Package Size: 0603; JLCPCB Basic Part: No; JLCPCB Part Number: C57837; Supplier 1: LCSC; Category: Inductors; Supplier Part Number 1: C57837; Tolerance: ±10%; Rated Current: 5mA; DC Resistance: 1.55Ω; RoHS: Yes; ComponentLink1Description: Datasheet; ComponentLink1URL: https://wmsc.lcsc.com/wmsc/upload/file/pdf/v2/lcsc/2310301641_Sunlord-SDFL1608S5R6KTF_C57837.pdf; ComponentLink2Description: JLCPCB Part URL; ComponentLink2URL: https://jlcpcb.com/partdetail/C57837; ComponentLink3Description: LCSC Part URL; ComponentLink3URL: https://lcsc.com/product-detail/Inductors-SMD_Sunlord-Sunlord-SDFL1608S5R6KTF_C57837.html
footprint IND-0603 (0603 (1608M) Inductor)
pins: 1, 2

## SDFL1608S6R8KTF
designator L?  Inductance: 6.8uH
Inductor, 6.8uH, ±10%, 1.7Ω, 5mA, SMD 0603; Manufacturer: Sunlord; Manufacturer Part Number: SDFL1608S6R8KTF; Q Factor: 35@4MHz; Package Size: 0603; JLCPCB Basic Part: No; JLCPCB Part Number: C75929; Supplier 1: LCSC; Category: Inductors; Supplier Part Number 1: C75929; Tolerance: ±10%; Rated Current: 5mA; DC Resistance: 1.7Ω; RoHS: Yes; ComponentLink1Description: Datasheet; ComponentLink1URL: https://wmsc.lcsc.com/wmsc/upload/file/pdf/v2/lcsc/2310301641_Sunlord-SDFL1608S6R8KTF_C75929.pdf; ComponentLink2Description: JLCPCB Part URL; ComponentLink2URL: https://jlcpcb.com/partdetail/C75929; ComponentLink3Description: LCSC Part URL; ComponentLink3URL: https://lcsc.com/product-detail/Inductors-SMD_Sunlord-Sunlord-SDFL1608S6R8KTF_C75929.html
footprint IND-0603 (0603 (1608M) Inductor)
pins: 1, 2

## SDFL1608S6R8MTF
designator L?  Inductance: 6.8uH
Inductor, 6.8uH, ±20%, 1.7Ω, 5mA, SMD 0603; Manufacturer: Sunlord; Manufacturer Part Number: SDFL1608S6R8MTF; Self-Resonant Frequency: 4MHz; Q Factor: 35@4MHz; Package Size: 0603; JLCPCB Basic Part: No; JLCPCB Part Number: C279872; Supplier 1: LCSC; Category: Inductors; Supplier Part Number 1: C279872; Tolerance: ±20%; Rated Current: 5mA; DC Resistance: 1.7Ω; RoHS: Yes; ComponentLink1Description: Datasheet; ComponentLink1URL: https://wmsc.lcsc.com/wmsc/upload/file/pdf/v2/lcsc/2310301641_Sunlord-SDFL1608S6R8MTF_C279872.pdf; ComponentLink2Description: JLCPCB Part URL; ComponentLink2URL: https://jlcpcb.com/partdetail/C279872; ComponentLink3Description: LCSC Part URL; ComponentLink3URL: https://lcsc.com/product-detail/Inductors-SMD_Sunlord-Sunlord-SDFL1608S6R8MTF_C279872.html
footprint IND-0603 (0603 (1608M) Inductor)
pins: 1, 2

## SDFL1608S8R2KTF
designator L?  Inductance: 8.2uH
Inductor, 8.2uH, ±10%, 2.1Ω, 5mA, SMD 0603; Manufacturer: Sunlord; Manufacturer Part Number: SDFL1608S8R2KTF; Self-Resonant Frequency: 4MHz; Q Factor: 35@4MHz; Package Size: 0603; JLCPCB Basic Part: No; JLCPCB Part Number: C95965; Supplier 1: LCSC; Category: Inductors; Supplier Part Number 1: C95965; Tolerance: ±10%; Rated Current: 5mA; DC Resistance: 2.1Ω; RoHS: Yes; ComponentLink1Description: Datasheet; ComponentLink1URL: https://wmsc.lcsc.com/wmsc/upload/file/pdf/v2/lcsc/2310301641_Sunlord-SDFL1608S8R2KTF_C95965.pdf; ComponentLink2Description: JLCPCB Part URL; ComponentLink2URL: https://jlcpcb.com/partdetail/C95965; ComponentLink3Description: LCSC Part URL; ComponentLink3URL: https://lcsc.com/product-detail/Inductors-SMD_Sunlord-Sunlord-SDFL1608S8R2KTF_C95965.html
footprint IND-0603 (0603 (1608M) Inductor)
pins: 1, 2

## SDFL1608S120KTF
designator L?  Inductance: 12uH
Inductor, 12uH, ±10%, 2.1Ω, 3mA, SMD 0603; Manufacturer: Sunlord; Manufacturer Part Number: SDFL1608S120KTF; Self-Resonant Frequency: 2MHz; Q Factor: 30@2MHz; Package Size: 0603; JLCPCB Basic Part: No; JLCPCB Part Number: C21306; Supplier 1: LCSC; Category: Inductors; Supplier Part Number 1: C21306; Tolerance: ±10%; Rated Current: 3mA; DC Resistance: 2.1Ω; RoHS: Yes; ComponentLink1Description: Datasheet; ComponentLink1URL: https://wmsc.lcsc.com/wmsc/upload/file/pdf/v2/lcsc/2310301641_Sunlord-SDFL1608S120KTF_C21306.pdf; ComponentLink2Description: JLCPCB Part URL; ComponentLink2URL: https://jlcpcb.com/partdetail/C21306; ComponentLink3Description: LCSC Part URL; ComponentLink3URL: https://lcsc.com/product-detail/Inductors-SMD_Sunlord-Sunlord-SDFL1608S120KTF_C21306.html
footprint IND-0603 (0603 (1608M) Inductor)
pins: 1, 2

## SDFL1608T150KTF
designator L?  Inductance: 15uH
Inductor, 15uH, ±10%, 1.7Ω, 1mA, SMD 0603; Manufacturer: Sunlord; Manufacturer Part Number: SDFL1608T150KTF; Self-Resonant Frequency: 1MHz; Q Factor: 20@1MHz; Package Size: 0603; JLCPCB Basic Part: No; JLCPCB Part Number: C57838; Supplier 1: LCSC; Category: Inductors; Supplier Part Number 1: C57838; Tolerance: ±10%; Rated Current: 1mA; DC Resistance: 1.7Ω; RoHS: Yes; ComponentLink1Description: Datasheet; ComponentLink1URL: https://wmsc.lcsc.com/wmsc/upload/file/pdf/v2/lcsc/2310301641_Sunlord-SDFL1608T150KTF_C57838.pdf; ComponentLink2Description: JLCPCB Part URL; ComponentLink2URL: https://jlcpcb.com/partdetail/C57838; ComponentLink3Description: LCSC Part URL; ComponentLink3URL: https://lcsc.com/product-detail/Inductors-SMD_Sunlord-Sunlord-SDFL1608T150KTF_C57838.html
footprint IND-0603 (0603 (1608M) Inductor)
pins: 1, 2

## SDFL1608T180KTF
designator L?  Inductance: 18uH
Inductor, 18uH, ±10%, 1.85Ω, 1mA, SMD 0603; Manufacturer: Sunlord; Manufacturer Part Number: SDFL1608T180KTF; Self-Resonant Frequency: 1MHz; Q Factor: 20@1MHz; Package Size: 0603; JLCPCB Basic Part: No; JLCPCB Part Number: C57839; Supplier 1: LCSC; Category: Inductors; Supplier Part Number 1: C57839; Tolerance: ±10%; Rated Current: 1mA; DC Resistance: 1.85Ω; RoHS: Yes; ComponentLink1Description: Datasheet; ComponentLink1URL: https://wmsc.lcsc.com/wmsc/upload/file/pdf/v2/lcsc/2310301641_Sunlord-SDFL1608T180KTF_C57839.pdf; ComponentLink2Description: JLCPCB Part URL; ComponentLink2URL: https://jlcpcb.com/partdetail/C57839; ComponentLink3Description: LCSC Part URL; ComponentLink3URL: https://lcsc.com/product-detail/Inductors-SMD_Sunlord-Sunlord-SDFL1608T180KTF_C57839.html
footprint IND-0603 (0603 (1608M) Inductor)
pins: 1, 2

## SDFL1608T220KTF
designator L?  Inductance: 22uH
Inductor, 22uH, ±10%, 2.1Ω, 1mA, SMD 0603; Manufacturer: Sunlord; Manufacturer Part Number: SDFL1608T220KTF; Self-Resonant Frequency: 1MHz; Q Factor: 20@1MHz; Package Size: 0603; JLCPCB Basic Part: No; JLCPCB Part Number: C57840; Supplier 1: LCSC; Category: Inductors; Supplier Part Number 1: C57840; Tolerance: ±10%; Rated Current: 1mA; DC Resistance: 2.1Ω; RoHS: Yes; ComponentLink1Description: Datasheet; ComponentLink1URL: https://wmsc.lcsc.com/wmsc/upload/file/pdf/v2/lcsc/2310301641_Sunlord-SDFL1608T220KTF_C57840.pdf; ComponentLink2Description: JLCPCB Part URL; ComponentLink2URL: https://jlcpcb.com/partdetail/C57840; ComponentLink3Description: LCSC Part URL; ComponentLink3URL: https://lcsc.com/product-detail/Inductors-SMD_Sunlord-Sunlord-SDFL1608T220KTF_C57840.html
footprint IND-0603 (0603 (1608M) Inductor)
pins: 1, 2

## SDFL1608T270KTF
designator L?  Inductance: 27uH
Inductor, 27uH, ±10%, 2.75Ω, 1mA, SMD 0603; Manufacturer: Sunlord; Manufacturer Part Number: SDFL1608T270KTF; Self-Resonant Frequency: 1MHz; Q Factor: 20@1MHz; Package Size: 0603; JLCPCB Basic Part: No; JLCPCB Part Number: C57841; Supplier 1: LCSC; Category: Inductors; Supplier Part Number 1: C57841; Tolerance: ±10%; Rated Current: 1mA; DC Resistance: 2.75Ω; RoHS: Yes; ComponentLink1Description: Datasheet; ComponentLink1URL: https://wmsc.lcsc.com/wmsc/upload/file/pdf/v2/lcsc/2310301641_Sunlord-SDFL1608T270KTF_C57841.pdf; ComponentLink2Description: JLCPCB Part URL; ComponentLink2URL: https://jlcpcb.com/partdetail/C57841; ComponentLink3Description: LCSC Part URL; ComponentLink3URL: https://lcsc.com/product-detail/Inductors-SMD_Sunlord-Sunlord-SDFL1608T270KTF_C57841.html
footprint IND-0603 (0603 (1608M) Inductor)
pins: 1, 2

## SDFL1608T330KTF
designator L?  Inductance: 33uH
Inductor, 33uH, ±10%, 2.95Ω, 1mA, SMD 0603; Manufacturer: Sunlord; Manufacturer Part Number: SDFL1608T330KTF; Self-Resonant Frequency: 1MHz; Q Factor: 20@1MHz; Package Size: 0603; JLCPCB Basic Part: No; JLCPCB Part Number: C316406; Supplier 1: LCSC; Category: Inductors; Supplier Part Number 1: C316406; Tolerance: ±10%; Rated Current: 1mA; DC Resistance: 2.95Ω; RoHS: Yes; ComponentLink1Description: Datasheet; ComponentLink1URL: https://wmsc.lcsc.com/wmsc/upload/file/pdf/v2/lcsc/2310301641_Sunlord-SDFL1608T330KTF_C316406.pdf; ComponentLink2Description: JLCPCB Part URL; ComponentLink2URL: https://jlcpcb.com/partdetail/C316406; ComponentLink3Description: LCSC Part URL; ComponentLink3URL: https://lcsc.com/product-detail/Inductors-SMD_Sunlord-Sunlord-SDFL1608T330KTF_C316406.html
footprint IND-0603 (0603 (1608M) Inductor)
pins: 1, 2

## SDWL1608C1N6CSTF
designator L?  Inductance: 1.6nH
Inductor, 1.6nH, 35mΩ, 1.15A, SMD 0603; Manufacturer: Sunlord; Manufacturer Part Number: SDWL1608C1N6CSTF; Package Size: 0603; JLCPCB Basic Part: No; JLCPCB Part Number: C370327; Supplier 1: LCSC; Category: Inductors; Supplier Part Number 1: C370327; Rated Current: 1.15A; DC Resistance: 35mΩ; RoHS: Yes; ComponentLink1Description: Datasheet; ComponentLink1URL: https://wmsc.lcsc.com/wmsc/upload/file/pdf/v2/lcsc/2110081530_Sunlord-SDWL1608C1N6CSTF_C370327.pdf; ComponentLink2Description: JLCPCB Part URL; ComponentLink2URL: https://jlcpcb.com/partdetail/C370327; ComponentLink3Description: LCSC Part URL; ComponentLink3URL: https://lcsc.com/product-detail/Inductors-SMD_Sunlord-Sunlord-SDWL1608C1N6CSTF_C370327.html
footprint IND-0603 (0603 (1608M) Inductor)
pins: 1, 2

## SDWL1608C1N6SSTF
designator L?  Inductance: 1.6nH
Inductor, 1.6nH, 35mΩ, 1.15A, SMD 0603; Manufacturer: Sunlord; Manufacturer Part Number: SDWL1608C1N6SSTF; Package Size: 0603; JLCPCB Basic Part: No; JLCPCB Part Number: C316383; Supplier 1: LCSC; Category: Inductors; Supplier Part Number 1: C316383; Rated Current: 1.15A; DC Resistance: 35mΩ; RoHS: Yes; ComponentLink1Description: Datasheet; ComponentLink1URL: https://wmsc.lcsc.com/wmsc/upload/file/pdf/v2/lcsc/2110081430_Sunlord-SDWL1608C1N6SSTF_C316383.pdf; ComponentLink2Description: JLCPCB Part URL; ComponentLink2URL: https://jlcpcb.com/partdetail/C316383; ComponentLink3Description: LCSC Part URL; ComponentLink3URL: https://lcsc.com/product-detail/Inductors-SMD_Sunlord-Sunlord-SDWL1608C1N6SSTF_C316383.html
footprint IND-0603 (0603 (1608M) Inductor)
pins: 1, 2

## SDWL1608C1N8JSTF
designator L?  Inductance: 1.8nH
Inductor, 1.8nH, ±5%, 43mΩ, 1A, SMD 0603; Manufacturer: Sunlord; Manufacturer Part Number: SDWL1608C1N8JSTF; Package Size: 0603; JLCPCB Basic Part: No; JLCPCB Part Number: C370328; Supplier 1: LCSC; Category: Inductors; Supplier Part Number 1: C370328; Tolerance: ±5%; Rated Current: 1A; DC Resistance: 43mΩ; RoHS: Yes; ComponentLink1Description: Datasheet; ComponentLink1URL: https://wmsc.lcsc.com/wmsc/upload/file/pdf/v2/lcsc/2110081530_Sunlord-SDWL1608C1N8JSTF_C370328.pdf; ComponentLink2Description: JLCPCB Part URL; ComponentLink2URL: https://jlcpcb.com/partdetail/C370328; ComponentLink3Description: LCSC Part URL; ComponentLink3URL: https://lcsc.com/product-detail/Inductors-SMD_Sunlord-Sunlord-SDWL1608C1N8JSTF_C370328.html
footprint IND-0603 (0603 (1608M) Inductor)
pins: 1, 2

## SDWL1608C1N8SSTF
designator L?  Inductance: 1.8nH
Inductor, 1.8nH, 43mΩ, 1A, SMD 0603; Manufacturer: Sunlord; Manufacturer Part Number: SDWL1608C1N8SSTF; Package Size: 0603; JLCPCB Basic Part: No; JLCPCB Part Number: C316382; Supplier 1: LCSC; Category: Inductors; Supplier Part Number 1: C316382; Rated Current: 1A; DC Resistance: 43mΩ; RoHS: Yes; ComponentLink1Description: Datasheet; ComponentLink1URL: https://wmsc.lcsc.com/wmsc/upload/file/pdf/v2/lcsc/2110081430_Sunlord-SDWL1608C1N8SSTF_C316382.pdf; ComponentLink2Description: JLCPCB Part URL; ComponentLink2URL: https://jlcpcb.com/partdetail/C316382; ComponentLink3Description: LCSC Part URL; ComponentLink3URL: https://lcsc.com/product-detail/Inductors-SMD_Sunlord-Sunlord-SDWL1608C1N8SSTF_C316382.html
footprint IND-0603 (0603 (1608M) Inductor)
pins: 1, 2

## SDWL1608C2N2JSTF
designator L?  Inductance: 2.2nH
Inductor, 2.2nH, ±5%, 150mΩ, 700mA, SMD 0603; Manufacturer: Sunlord; Manufacturer Part Number: SDWL1608C2N2JSTF; Package Size: 0603; JLCPCB Basic Part: No; JLCPCB Part Number: C370333; Supplier 1: LCSC; Category: Inductors; Supplier Part Number 1: C370333; Tolerance: ±5%; Rated Current: 700mA; DC Resistance: 150mΩ; RoHS: Yes; ComponentLink1Description: Datasheet; ComponentLink1URL: https://wmsc.lcsc.com/wmsc/upload/file/pdf/v2/lcsc/2110081530_Sunlord-SDWL1608C2N2JSTF_C370333.pdf; ComponentLink2Description: JLCPCB Part URL; ComponentLink2URL: https://jlcpcb.com/partdetail/C370333; ComponentLink3Description: LCSC Part URL; ComponentLink3URL: https://lcsc.com/product-detail/Inductors-SMD_Sunlord-Sunlord-SDWL1608C2N2JSTF_C370333.html
footprint IND-0603 (0603 (1608M) Inductor)
pins: 1, 2

## SDWL1608C2N2JSTFN01
designator L?  Inductance: 2.2nH
Inductor, 2.2nH, ±5%, SMD 0603; Manufacturer: Sunlord; Manufacturer Part Number: SDWL1608C2N2JSTFN01; Package Size: 0603; JLCPCB Basic Part: No; JLCPCB Part Number: C370334; Supplier 1: LCSC; Category: Inductors; Supplier Part Number 1: C370334; Tolerance: ±5%; RoHS: Yes; ComponentLink1Description: Datasheet; ComponentLink2Description: JLCPCB Part URL; ComponentLink2URL: https://jlcpcb.com/partdetail/C370334; ComponentLink3Description: LCSC Part URL; ComponentLink3URL: https://lcsc.com/product-detail/Inductors-SMD_Sunlord-Sunlord-SDWL1608C2N2JSTFN01_C370334.html
footprint IND-0603 (0603 (1608M) Inductor)
pins: 1, 2
